# Altium footprint library klp.PcbLib: 436 footprints (part 2 of 28)
Each footprint in its own frame and in the unit in brackets; x right, y up, seen from the top. Pads: shape width x height; smd on the part's side, far side on the other; paste and mask are expansions set on the pad; w line width, h text height; cw(c..) or ccw(c..) is an arc to the next point about the centre after c.
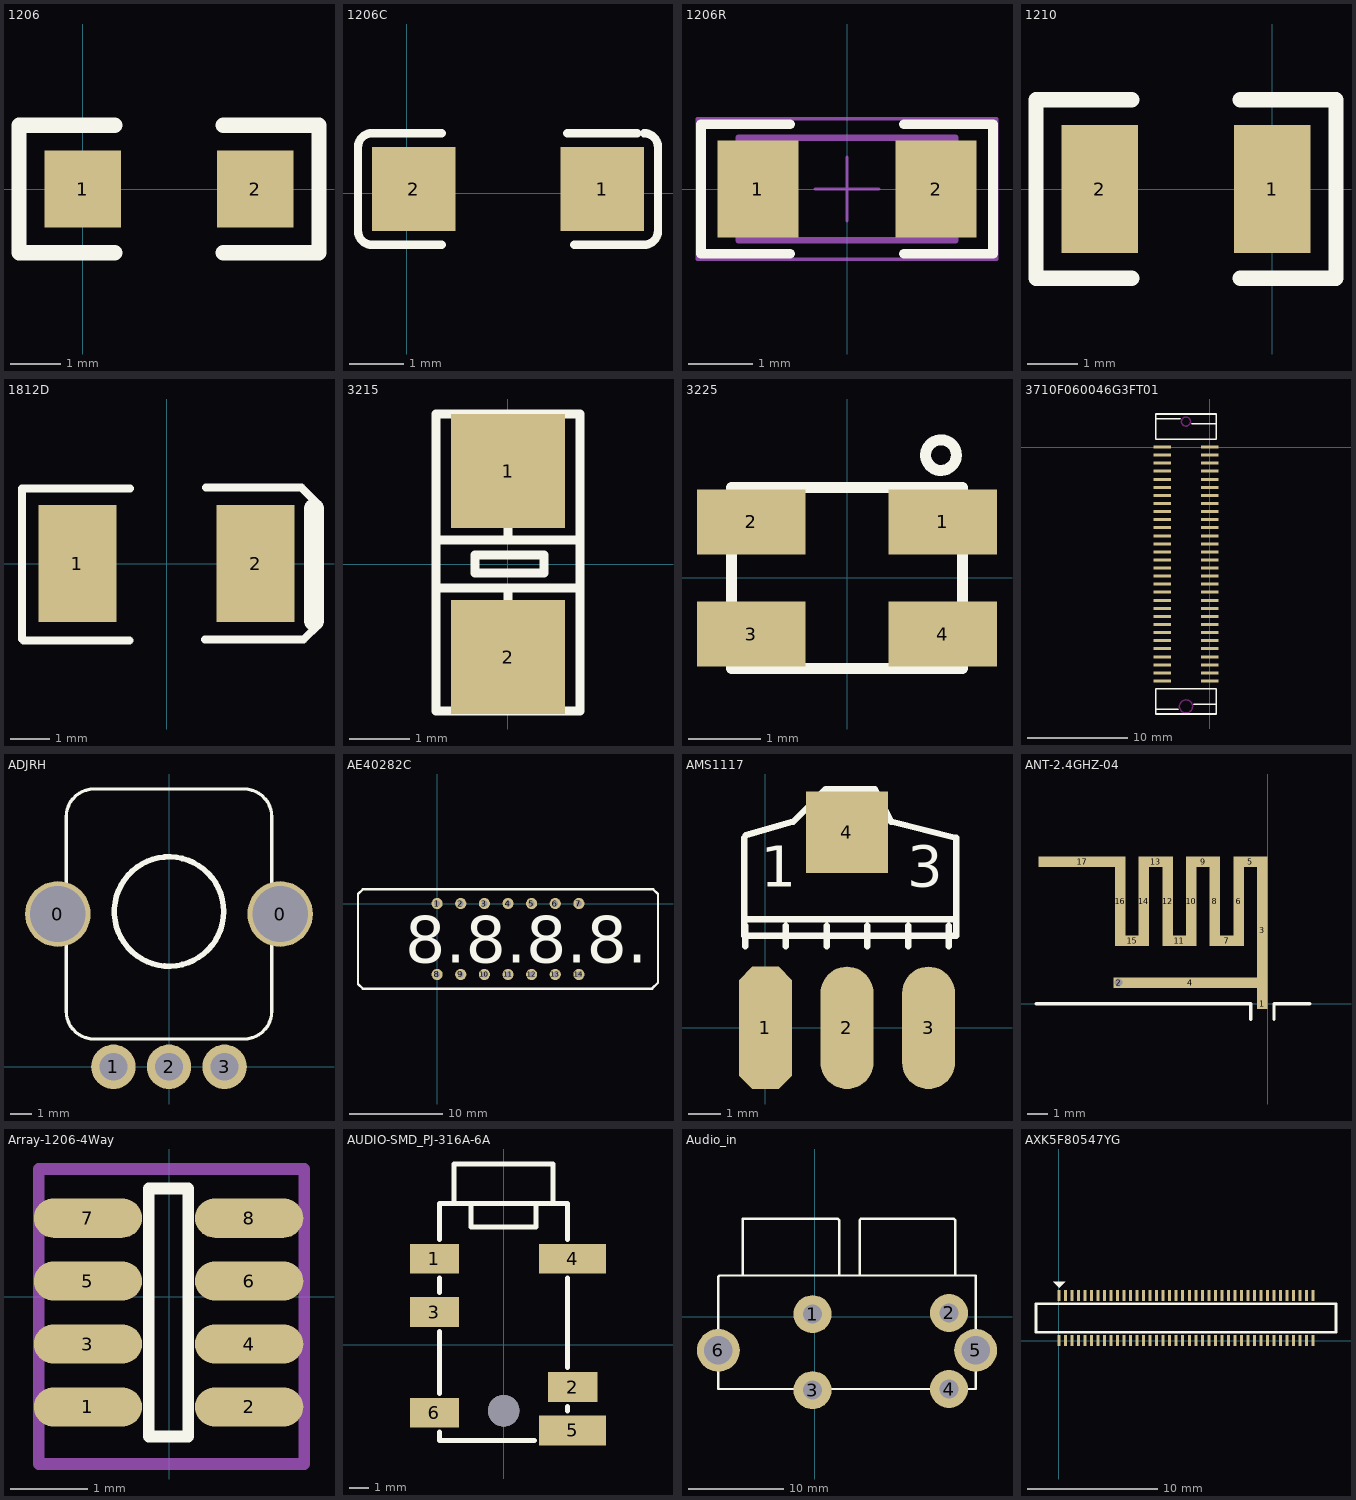
[diagram p1: the footprints below, top view; thin cyan lines are the x and y axes]

## 1206 [mil]
pads (2):
  rect 60x60 smd: 1(0,0) 2(135,0)
Top Overlay:
  lines w12: 25,-50 -50,-50 -50,50 25,50 ; 110,-50 185,-50 185,50 110,50

## 1206C [mil]
pads (2):
  rect 60x60 smd: 1(140,3) 2(5,3)
Top Overlay:
  lines w6: 25,-37 -25,-37 cw(c-25,-27) -35,-27 -35,33 cw(c-25,33) -25,43 25,43 ; 115,43 165,43 ; 120,-37 170,-37 ccw(c170,-27) 180,-27 180,33 ccw(c170,33) 170,43

## 1206R [mil]
pads (2):
  rect 50x60 smd: 1(-55,0) 2(55,0)
Top Overlay:
  lines w6: -35,-40 -90,-40 -90,40 -35,40 ; 35,-40 90,-40 90,40 35,40
Mechanical 15:
  lines w3.94: -66.93,-31.5 -66.93,31.5 66.93,31.5 66.93,-31.5 -66.93,-31.5
  text "1" at -6.47,-17.71 h29.53
Mechanical 16:
  lines w0.04: -66.93,-31.5 -66.93,31.5 66.93,31.5 66.93,-31.5 -66.93,-31.5
  lines w1.97: -19.68,0 19.68,0 ; 0,-19.68 0,19.68 ; -92.52,-43.31 -92.52,43.31 92.52,43.31 92.52,-43.31 -92.52,-43.31
3D body "R1206.STEP": height 23.62, standoff 0, extent -62.93,-31.5 63.06,31.5

## 1210 [mil]
pads (2):
  rect 60x100 smd: 1(0,0) 2(-135,0)
Top Overlay:
  lines w12: -110,-70 -185,-70 -185,70 -110,70 ; -25,-70 50,-70 50,70 -25,70

## 1812D [mm]
pads (2):
  rect 2x3 smd: 1(-2.286,0) 2(2.286,0)
Top Overlay:
  lines w0.203: -3.2,1.93 -0.94,1.93 ; -3.176,-1.97 -0.954,-1.97 ; -1.27,-1.97 -0.954,-1.97 ; 0.986,-1.951 3.307,-1.951 3.51,-1.951 3.912,-1.549 ; 1.009,1.949 3.247,1.949 3.461,1.949 3.861,1.549 ; -3.708,1.93 -0.94,1.93 ; -3.708,1.93 -3.708,-1.93 -3.669,-1.97 -0.954,-1.97 ; -3.708,1.93 -0.94,1.93
  lines w0.508: 3.785,-1.473 3.785,1.412
3D body: height 1.32, standoff 0, extent 2.286,-1.016 2.54,1.016
3D body: height 1.32, standoff 0, extent -2.54,-1.016 -2.286,1.016
3D body: height 2.19, standoff 2.18, extent 1.473,-1.727 2.184,1.727
3D body: height 2.18, standoff 0, extent -2.286,-1.727 2.286,1.727

## 3215 [mm]
pads (2):
  rrect0% 1.9x1.9 smd: 1(0,1.55) 2(0,-1.55)
Top Overlay:
  lines w0.152: -1.15,-0.4 1.2,-0.4 ; -1.15,0.4 1.15,0.4 ; 0,-0.9 0,-0.4 ; 0,0.45 0,0.85 ; -1.2,-2.45 -1.2,2.5 1.2,2.5 1.2,-2.45 -1.2,-2.45 ; -0.55,-0.15 -0.55,0.15 0.6,0.15 0.6,-0.15 -0.55,-0.15
3D body "User Library-ABS07.STEP": height 0.91, standoff 0, extent -0.76,-1.535 0.76,1.685

## 3225 [mm]
pads (4):
  rect 1.5x0.9 smd: 1(1.325,0.775) 2(-1.325,0.775) 3(-1.325,-0.775) 4(1.325,-0.775)
Top Overlay:
  circle w0.152: c1.3,1.7 r0.212
  lines w0.152: -1.6,-1.25 1.6,-1.25 1.6,1.25 -1.6,1.25 -1.6,-1.25
3D body "User Library-3225-1.step": height 0.61, standoff 0, extent -1.65,-1.3 1.55,1.2

## 3710F060046G3FT01 [mm]
pads (60):
  rect 1.7x0.3 smd: 1(-4.7,0) 2(-4.7,-0.8) 3(-4.7,-1.6) 4(-4.7,-2.4) 5(-4.7,-3.2) 6(-4.7,-4) 7(-4.7,-4.8) 8(-4.7,-5.6) 9(-4.7,-6.4) 10(-4.7,-7.2) 11(-4.7,-8) 12(-4.7,-8.8) 13(-4.7,-9.6) 14(-4.7,-10.4) 15(-4.7,-11.2) 16(-4.7,-12) 17(-4.7,-12.8) 18(-4.7,-13.6) 19(-4.7,-14.4) 20(-4.7,-15.2) 21(-4.7,-16) 22(-4.7,-16.8) 23(-4.7,-17.6) 24(-4.7,-18.4) 25(-4.7,-19.2) 26(-4.7,-20) 27(-4.7,-20.8) 28(-4.7,-21.6) 29(-4.7,-22.4) 30(-4.7,-23.2) 31(0,-23.2) 32(0,-22.4) 33(0,-21.6) 34(0,-20.8) 35(0,-20) 36(0,-19.2) 37(0,-18.4) 38(0,-17.6) 39(0,-16.8) 40(0,-16) 41(0,-15.2) 42(0,-14.4) 43(0,-13.6) 44(0,-12.8) 45(0,-12) 46(0,-11.2) 47(0,-10.4) 48(0,-9.6) 49(0,-8.8) 50(0,-8) 51(0,-7.2) 52(0,-6.4) 53(0,-5.6) 54(0,-4.8) 55(0,-4) 56(0,-3.2) 57(0,-2.4) 58(0,-1.6) 59(0,-0.8) 60(0,0)
Top Overlay:
  lines w0.152: -5.35,-26 -3.1,-26 ; -5.35,2.8 -2.9,2.8 ; -1.8,2.3 0.65,2.3 ; -1.6,-25.5 0.65,-25.5 ; 0.625,0.775 -5.35,0.775 -5.35,3.275 0.65,3.275 0.65,0.775 ; -5.35,-26.475 0.65,-26.475 0.65,-23.975 -5.35,-23.975 -5.35,-26.475
Keep-Out Layer:
  circle w0.152: c-2.35,-25.725 r0.65
  circle w0.152: c-2.35,2.525 r0.45

## ADJRH [mil]
pads (5):
  round 118.11 hole 100: 0(-200,275) 0(200,275)
  round 80 hole 50: 1(-100,0) 2(0,0) 3(100,0)
Top Overlay:
  circle w10: c0,279.48 r98.43
  lines w6: -185,100 ccw(c-135,100) -135,50 135,50 ccw(c135,100) 185,100 185,450 ccw(c135,450) 135,500 -135,500 ccw(c-135,450) -185,450 -185,100

## AE40282C [mm]
height 0.5
pads (14):
  round 1.2 hole 0.635: 1(0,0) 2(2.54,0) 3(5.08,0) 4(7.62,0) 5(10.16,0) 6(12.7,0) 7(15.24,0) 8(0,-7.62) 9(2.54,-7.62) 10(5.08,-7.62) 11(7.62,-7.62) 12(10.16,-7.62) 13(12.7,-7.62) 14(15.24,-7.62)
Top Overlay:
  lines w0.254: -5.207,-9.144 20.32,-9.144 ; -4.826,-9.144 23.114,-9.144 23.749,-8.509 23.749,1.016 23.241,1.524 -8.001,1.524 -8.509,1.016 -8.509,-8.636 -8.001,-9.144 0.889,-9.144
  text "8.8.8.8." at -3.429,-6.35 h5

## AMS1117 [mil]
pads (4):
  oct 65x150 smd: 1(0.03,-0.06)
  oval 65x150 smd: 2(100.03,-0.06) 3(200.03,-0.06)
  rect 100x100 smd: 4(100.03,239.94)
Top Overlay:
  lines w7.87: -25.97,232.94 -25.97,132.94 ; -24.97,99.94 -24.97,124.94 ; -24.3,236.27 34.03,252.94 74.03,292.94 134.03,292.94 154.03,252.94 234.03,232.94 234.03,112.94 ; 25.03,99.94 25.03,124.94 ; 75.03,99.94 75.03,124.94 ; 125.03,99.94 125.03,124.94 ; 175.03,99.94 175.03,124.94 ; 225.03,99.94 225.03,124.94 ; -25.97,132.94 -25.97,112.94 234.03,112.94 ; -25.97,132.94 234.03,132.94 234.03,112.94
  text "1" at -5.97,172.94 h50
  text "3" at 174.03,172.94 h50

## ANT-2.4GHZ-04 [mil]
pads (17):
  rect 20x20 smd: 1(-10,0)
  round 20 hole 15: 2(-283,40)
  rect 20x280 smd: 3(-10,140)
  rect 293x20 smd: 4(-146.5,40)
  rect 65x20 smd: 5(-32.5,270) 7(-77.5,120) 9(-122.5,270) 11(-167.5,120) 13(-212.5,270) 15(-257.5,120)
  rect 20x170 smd: 6(-55,195) 8(-100,195) 10(-145,195) 12(-190,195) 14(-235,195) 16(-280,195)
  rect 165x20 smd: 17(-352.5,270)
Top Overlay:
  lines w6: -440,0 -32,0 -32,-30 ; 12,-30 12,0 80,0
Bottom Overlay:
  lines w6: -440,60 -32,60 -32,0 80,0

## Array-1206-4Way [mil]
pads (8):
  oval 55x20 smd: 1(-41.34,-56.1) 2(40.66,-56.1) 3(-41.34,-24.1) 4(40.66,-24.1) 5(-41.34,7.9) 6(40.66,7.9) 7(-41.34,39.9) 8(40.66,39.9)
Top Overlay:
  lines w6: -10.34,-71.1 -10.34,54.9 9.66,54.9 9.66,-71.1 -10.34,-71.1
Mechanical 16:
  lines w6: -66.34,-85.1 -66.34,64.9 68.66,64.9 68.66,-85.1 -66.34,-85.1
3D body "User Library-Array-1206-4Way-Var2-1.STEP": height 19.68, standoff 0, extent -30.51,-69.88 32.48,56.11

## AUDIO-SMD_PJ-316A-6A [mm]
pads (7):
  rect 2.5x1.5 smd: 1(-3.5,4.35) 2(3.5,-2.15) 3(-3.5,1.65) 6(-3.5,-3.45)
  rect 3.4x1.5 smd: 4(3.5,4.35) 5(3.5,-4.35)
  round 1.6 hole 1.6 unplated: ""(0,-3.35)
Top Overlay:
  lines w0.254: -3.25,-4.431 -3.25,-4.85 1.569,-4.85 ; -3.25,-2.469 -3.25,0.669 ; -3.25,2.631 -3.25,3.369 ; -3.25,5.331 -3.25,7.15 3.25,7.15 3.25,5.331 ; -2.5,7.15 -2.499,8.356 -2.5,9.15 2.5,9.15 2.5,7.15 ; -1.65,7.15 -1.65,5.95 1.65,5.95 1.65,7.15 ; 3.25,-3.369 3.25,-3.131 ; 3.25,-1.169 3.25,3.369

## Audio_in [mm]
height 20
pads (6):
  round 4 hole 2: 1(-0.254,0.254) 2(14.097,0.381) 3(-0.254,-7.747) 4(14.097,-7.62)
  round 4.5 hole 3: 5(16.891,-3.556) 6(-10.16,-3.556)
Top Overlay:
  lines w0.254: -7.62,4.318 -7.62,10.287 2.413,10.287 2.54,10.16 2.54,4.318 ; -6.985,4.318 10.795,4.318 ; -6.096,4.318 -10.033,4.318 -10.16,4.191 -10.16,-7.62 10.16,-7.62 ; 4.699,4.318 4.699,9.906 4.699,10.16 4.826,10.287 6.223,10.287 ; 5.842,10.287 7.747,10.287 14.605,10.287 14.732,10.16 14.732,4.318 ; 9.652,-7.62 16.891,-7.62 16.891,2.54 16.891,4.318 10.033,4.318

## AXK5F80547YG [mm]
pads (80):
  rect 0.23x0.85 smd: 1(0,3.45) 2(0,0) 3(0.5,3.45) 4(0.5,0) 5(1,3.45) 6(1,0) 7(1.5,3.45) 8(1.5,0) 9(2,3.45) 10(2,0) 11(2.5,3.45) 12(2.5,0) 13(3,3.45) 14(3,0) 15(3.5,3.45) 16(3.5,0) 17(4,3.45) 18(4,0) 19(4.5,3.45) 20(4.5,0) 21(5,3.45) 22(5,0) 23(5.5,3.45) 24(5.5,0) 25(6,3.45) 26(6,0) 27(6.5,3.45) 28(6.5,0) 29(7,3.45) 30(7,0) 31(7.5,3.45) 32(7.5,0) 33(8,3.45) 34(8,0) 35(8.5,3.45) 36(8.5,0) 37(9,3.45) 38(9,0) 39(9.5,3.45) 40(9.5,0) 41(10,3.45) 42(10,0) 43(10.5,3.45) 44(10.5,0) 45(11,3.45) 46(11,0) 47(11.5,3.45) 48(11.5,0) 49(12,3.45) 50(12,0) 51(12.5,3.45) 52(12.5,0) 53(13,3.45) 54(13,0) 55(13.5,3.45) 56(13.5,0) 57(14,3.45) 58(14,0) 59(14.5,3.45) 60(14.5,0) 61(15,3.45) 62(15,0) 63(15.5,3.45) 64(15.5,0) 65(16,3.45) 66(16,0) 67(16.5,3.45) 68(16.5,0) 69(17,3.45) 70(17,0) 71(17.5,3.45) 72(17.5,0) 73(18,3.45) 74(18,0) 75(18.5,3.45) 76(18.5,0) 77(19,3.45) 78(19,0) 79(19.5,3.45) 80(19.5,0)
Top Overlay:
  region: 0.025,4.05 0.475,4.5 -0.425,4.5
  lines w0.2: -1.75,0.625 -1.75,2.825 21.25,2.825 21.25,0.625 -1.75,0.625